# Altium footprint library ZH1.5.PcbLib: 60 footprints (part 1 of 4)
Each footprint in its own frame and in the unit in brackets; x right, y up, seen from the top. Pads: shape width x height; smd on the part's side, far side on the other; paste and mask are expansions set on the pad; w line width, h text height; cw(c..) or ccw(c..) is an arc to the next point about the centre after c.
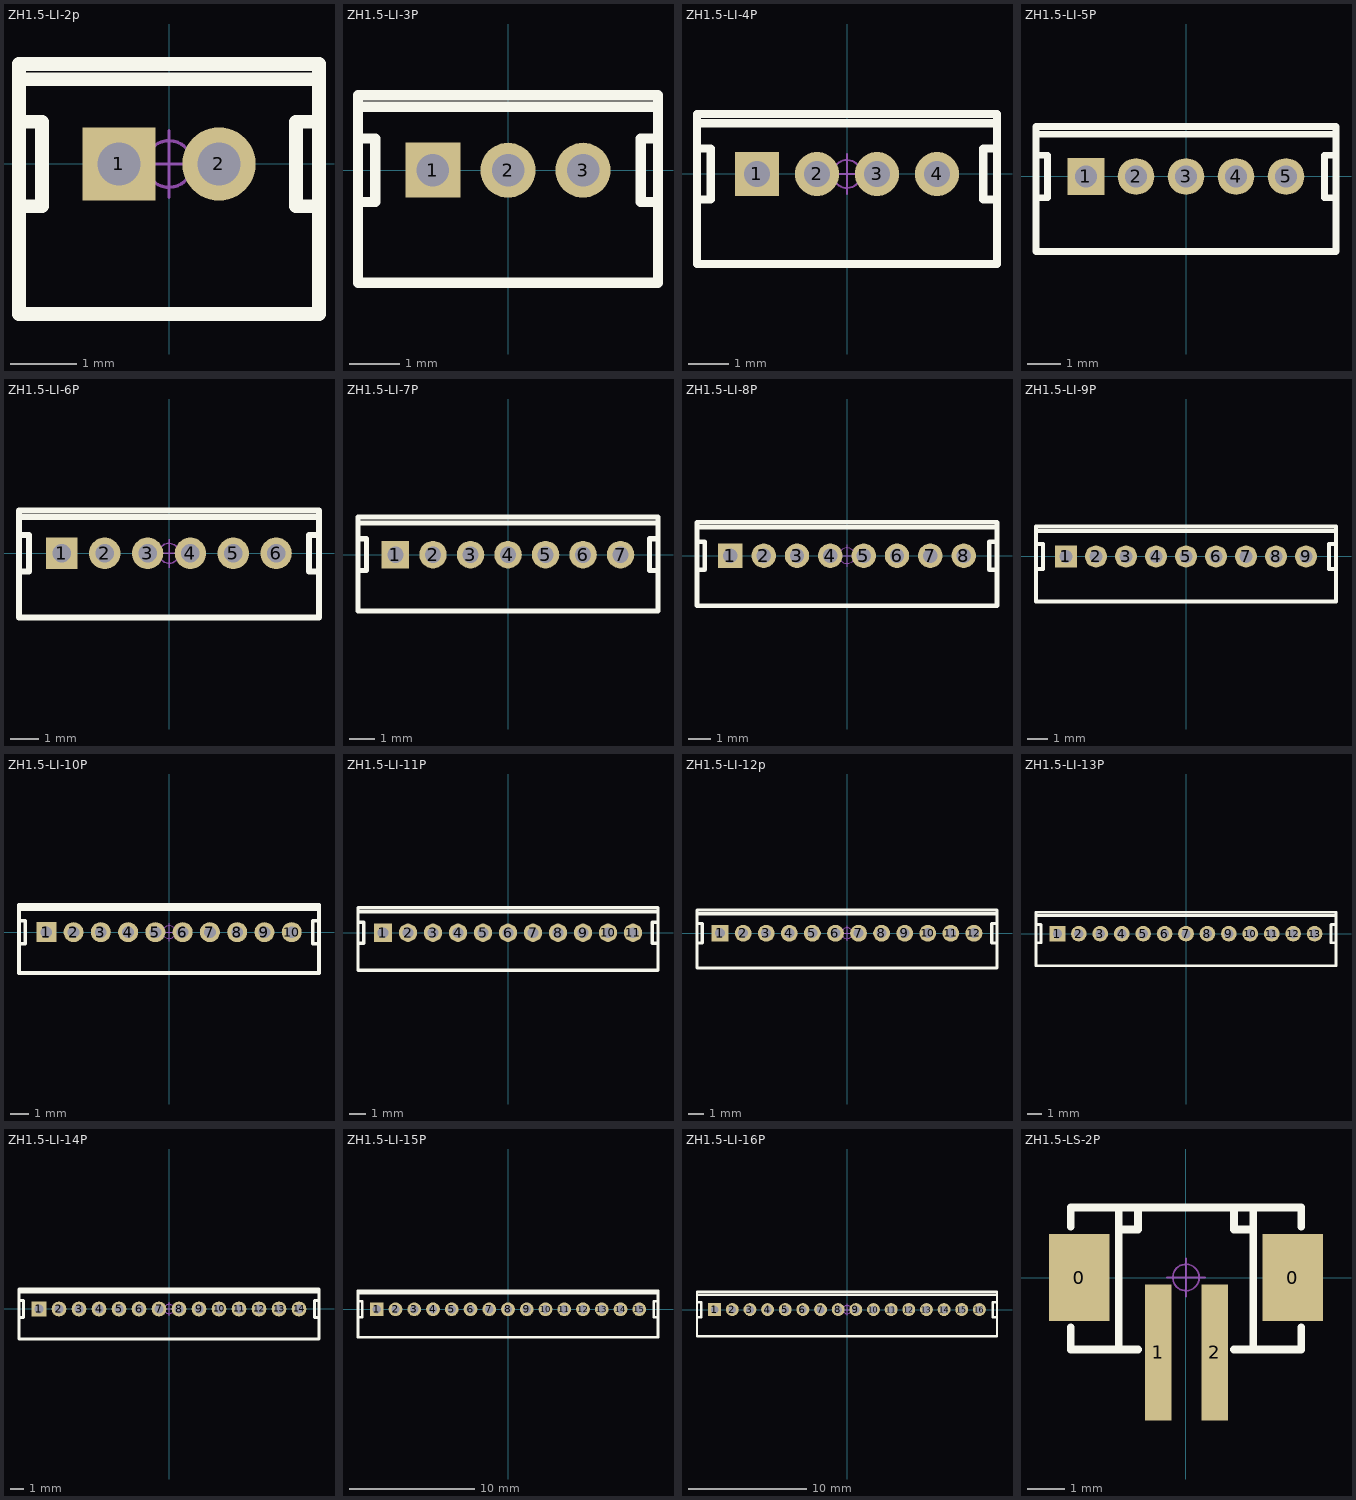
[diagram p0: the footprints below, top view; thin cyan lines are the x and y axes]

## ZH1.5-LI-2p [mm] "长：4.5，宽：3.65，高：4.55"
pads (2):
  rect 1.1x1.1 hole 0.65: 1(-0.75,0)
  round 1.1 hole 0.65: 2(0.75,0)
Top Overlay:
  lines w0.203: -2.25,-0.635 -1.905,-0.635 -1.905,0.635 -2.25,0.635 ; -2.25,1.27 2.25,1.27 ; 2.25,-0.635 1.905,-0.635 1.905,0.635 2.25,0.635 ; -2.25,-2.25 2.25,-2.25 2.25,1.5 -2.25,1.5 -2.25,-2.25
Mechanical 15:
  circle w0.05: c0,0 r0.35
  lines w0.05: -0.5,0 0.5,0 ; 0,-0.5 0,0.5
3D body: height 4.6, standoff -2.55, extent -2.25,-2.15 2.25,1.5

## ZH1.5-LI-3P [mm] "长：6.0，宽：3.65，高：4.55"
pads (3):
  rect 1.1x1.1 hole 0.65: 1(-1.5,0)
  round 1.1 hole 0.65: 2(0,0) 3(1.5,0)
Top Overlay:
  lines w0.203: -3,-0.635 -2.655,-0.635 -2.655,0.635 -3,0.635 ; -3,1.27 3,1.27 ; 3,-0.635 2.655,-0.635 2.655,0.635 3,0.635 ; -3,-2.25 -3,1.5 3,1.5 3,-2.25 -3,-2.25
Mechanical 15:
  circle w0.05: c0,0 r0.35
  lines w0.05: -0.5,0 0.5,0 ; 0,-0.5 0,0.5
3D body: height 4.6, standoff -2.55, extent -3,-2.15 3,1.5

## ZH1.5-LI-4P [mm] "长：7.5，宽：3.65，高：4.55"
pads (4):
  rect 1.1x1.1 hole 0.65: 1(-2.25,0)
  round 1.1 hole 0.65: 2(-0.75,0) 3(0.75,0) 4(2.25,0)
Top Overlay:
  lines w0.203: -3.75,-0.635 -3.405,-0.635 -3.405,0.635 -3.75,0.635 ; -3.75,1.27 3.75,1.27 ; 3.75,-0.635 3.405,-0.635 3.405,0.635 3.75,0.635 ; -3.75,-2.25 -3.75,1.5 3.75,1.5 3.75,-2.25 -3.75,-2.25
Mechanical 15:
  circle w0.05: c0,0 r0.35
  lines w0.05: -0.5,0 0.5,0 ; 0,-0.5 0,0.5
3D body: height 4.6, standoff -2.55, extent -3.75,-2.15 3.75,1.5

## ZH1.5-LI-5P [mm] "长：9.0，宽：3.65，高：4.55"
pads (5):
  rect 1.1x1.1 hole 0.65: 1(-3,0)
  round 1.1 hole 0.65: 2(-1.5,0) 3(0,0) 4(1.5,0) 5(3,0)
Top Overlay:
  lines w0.203: -4.5,-0.635 -4.155,-0.635 -4.155,0.635 -4.5,0.635 ; -4.5,1.27 4.5,1.27 ; 4.5,-0.635 4.155,-0.635 4.155,0.635 4.5,0.635 ; -4.5,-2.25 4.5,-2.25 4.5,1.5 -4.5,1.5 -4.5,-2.25
Mechanical 15:
  circle w0.05: c0,0 r0.35
  lines w0.05: -0.5,0 0.5,0 ; 0,-0.5 0,0.5
3D body: height 4.6, standoff -2.55, extent -4.5,-2.15 4.5,1.5

## ZH1.5-LI-6P [mm] "长：10.5，宽：3.65，高：4.55"
pads (6):
  rect 1.1x1.1 hole 0.65: 1(-3.75,0)
  round 1.1 hole 0.65: 2(-2.25,0) 3(-0.75,0) 4(0.75,0) 5(2.25,0) 6(3.75,0)
Top Overlay:
  lines w0.203: -5.25,-0.635 -4.905,-0.635 -4.905,0.635 -5.25,0.635 ; -5.25,1.27 5.25,1.27 ; 5.25,-0.635 4.905,-0.635 4.905,0.635 5.25,0.635 ; -5.25,-2.25 -5.25,1.5 5.25,1.5 5.25,-2.25 -5.25,-2.25
Mechanical 15:
  circle w0.05: c0,0 r0.35
  lines w0.05: -0.5,0 0.5,0 ; 0,-0.5 0,0.5
3D body: height 4.6, standoff -2.55, extent -5.25,-2.15 5.25,1.5

## ZH1.5-LI-7P [mm] "长：12.0，宽：3.65，高：4.55"
pads (7):
  rect 1.1x1.1 hole 0.65: 1(-4.5,0)
  round 1.1 hole 0.65: 2(-3,0) 3(-1.5,0) 4(0,0) 5(1.5,0) 6(3,0) 7(4.5,0)
Top Overlay:
  lines w0.203: -6,-0.635 -5.655,-0.635 -5.655,0.635 -6,0.635 ; -6,1.27 6,1.27 ; 6,-0.635 5.655,-0.635 5.655,0.635 6,0.635 ; -6,-2.25 6,-2.25 6,1.5 -6,1.5 -6,-2.25
Mechanical 15:
  circle w0.05: c0,0 r0.35
  lines w0.05: -0.5,0 0.5,0 ; 0,-0.5 0,0.5
3D body: height 4.6, standoff -2.55, extent -6,-2.15 6,1.5

## ZH1.5-LI-8P [mm] "长：13.5，宽：3.65，高：4.55"
pads (8):
  rect 1.1x1.1 hole 0.65: 1(-5.25,0)
  round 1.1 hole 0.65: 2(-3.75,0) 3(-2.25,0) 4(-0.75,0) 5(0.75,0) 6(2.25,0) 7(3.75,0) 8(5.25,0)
Top Overlay:
  lines w0.203: -6.75,-0.635 -6.405,-0.635 -6.405,0.635 -6.75,0.635 ; -6.75,1.27 6.75,1.27 ; 6.75,-0.635 6.405,-0.635 6.405,0.635 6.75,0.635 ; -6.75,-2.25 -6.75,1.5 6.75,1.5 6.75,-2.25 -6.75,-2.25
Mechanical 15:
  circle w0.05: c0,0 r0.35
  lines w0.05: -0.5,0 0.5,0 ; 0,-0.5 0,0.5
3D body: height 4.6, standoff -2.55, extent -6.75,-2.15 6.75,1.5

## ZH1.5-LI-9P [mm] "长：15.0，宽：3.65，高：4.55"
pads (9):
  rect 1.1x1.1 hole 0.65: 1(-6,0)
  round 1.1 hole 0.65: 2(-4.5,0) 3(-3,0) 4(-1.5,0) 5(0,0) 6(1.5,0) 7(3,0) 8(4.5,0) 9(6,0)
Top Overlay:
  lines w0.203: -7.5,-0.635 -7.155,-0.635 -7.155,0.635 -7.5,0.635 ; -7.5,1.27 7.5,1.27 ; 7.5,-0.635 7.155,-0.635 7.155,0.635 7.5,0.635 ; -7.5,-2.25 -7.5,1.5 7.5,1.5 7.5,-2.25 -7.5,-2.25
Mechanical 15:
  circle w0.05: c0,0 r0.35
  lines w0.05: -0.5,0 0.5,0 ; 0,-0.5 0,0.5
3D body: height 4.6, standoff -2.55, extent -7.5,-2.15 7.5,1.5

## ZH1.5-LI-10P [mm] "长：16.5，宽：3.65，高：4.55"
pads (10):
  rect 1.1x1.1 hole 0.65: 1(-6.75,0)
  round 1.1 hole 0.65: 2(-5.25,0) 3(-3.75,0) 4(-2.25,0) 5(-0.75,0) 6(0.75,0) 7(2.25,0) 8(3.75,0) 9(5.25,0) 10(6.75,0)
Top Overlay:
  lines w0.203: -8.25,-0.635 -7.905,-0.635 -7.905,0.635 -8.25,0.635 ; -8.25,1.27 8.25,1.27 ; 8.25,-0.635 7.905,-0.635 7.905,0.635 8.25,0.635 ; -8.25,-2.25 8.25,-2.25 8.25,1.5 -8.25,1.5 -8.25,-2.25
Mechanical 15:
  circle w0.05: c0,0 r0.35
  lines w0.05: -0.5,0 0.5,0 ; 0,-0.5 0,0.5
3D body: height 4.6, standoff -2.55, extent -8.25,-2.15 8.25,1.5

## ZH1.5-LI-11P [mm] "长：18.0，宽：3.65，高：4.55"
pads (11):
  rect 1.1x1.1 hole 0.65: 1(-7.5,0)
  round 1.1 hole 0.65: 2(-6,0) 3(-4.5,0) 4(-3,0) 5(-1.5,0) 6(0,0) 7(1.5,0) 8(3,0) 9(4.5,0) 10(6,0) 11(7.5,0)
Top Overlay:
  lines w0.203: -9,-0.635 -8.655,-0.635 -8.655,0.635 -9,0.635 ; -9,1.27 9,1.27 ; 9,-0.635 8.655,-0.635 8.655,0.635 9,0.635 ; -9,-2.25 -9,1.5 9,1.5 9,-2.25 -9,-2.25
Mechanical 15:
  circle w0.05: c0,0 r0.35
  lines w0.05: -0.5,0 0.5,0 ; 0,-0.5 0,0.5
3D body: height 4.6, standoff -2.55, extent -9,-2.15 9,1.5

## ZH1.5-LI-12p [mm] "长：19.5，宽：3.65，高：4.55"
pads (12):
  rect 1.1x1.1 hole 0.65: 1(-8.25,0)
  round 1.1 hole 0.65: 2(-6.75,0) 3(-5.25,0) 4(-3.75,0) 5(-2.25,0) 6(-0.75,0) 7(0.75,0) 8(2.25,0) 9(3.75,0) 10(5.25,0) 11(6.75,0) 12(8.25,0)
Top Overlay:
  lines w0.203: -9.75,-0.635 -9.405,-0.635 -9.405,0.635 -9.75,0.635 ; -9.75,1.27 9.75,1.27 ; 9.75,-0.635 9.405,-0.635 9.405,0.635 9.75,0.635 ; -9.75,-2.25 9.75,-2.25 9.75,1.5 -9.75,1.5 -9.75,-2.25
Mechanical 15:
  circle w0.05: c0,0 r0.35
  lines w0.05: -0.5,0 0.5,0 ; 0,-0.5 0,0.5
3D body: height 4.6, standoff -2.55, extent -9.75,-2.15 9.75,1.5

## ZH1.5-LI-13P [mm] "长：21.0，宽：3.65，高：4.55"
pads (13):
  rect 1.1x1.1 hole 0.65: 1(-9,0)
  round 1.1 hole 0.65: 2(-7.5,0) 3(-6,0) 4(-4.5,0) 5(-3,0) 6(-1.5,0) 7(0,0) 8(1.5,0) 9(3,0) 10(4.5,0) 11(6,0) 12(7.5,0) 13(9,0)
Top Overlay:
  lines w0.203: -10.5,-0.635 -10.155,-0.635 -10.155,0.635 -10.5,0.635 ; -10.5,1.27 10.5,1.27 ; 10.5,-0.635 10.155,-0.635 10.155,0.635 10.5,0.635 ; -10.5,-2.25 10.5,-2.25 10.5,1.5 -10.5,1.5 -10.5,-2.25
Mechanical 15:
  circle w0.05: c0,0 r0.35
  lines w0.05: -0.5,0 0.5,0 ; 0,-0.5 0,0.5
3D body: height 4.6, standoff -2.55, extent -10.5,-2.15 10.5,1.5

## ZH1.5-LI-14P [mm] "长：22.5，宽：3.65，高：4.55"
pads (14):
  rect 1.1x1.1 hole 0.65: 1(-9.75,0)
  round 1.1 hole 0.65: 2(-8.25,0) 3(-6.75,0) 4(-5.25,0) 5(-3.75,0) 6(-2.25,0) 7(-0.75,0) 8(0.75,0) 9(2.25,0) 10(3.75,0) 11(5.25,0) 12(6.75,0) 13(8.25,0) 14(9.75,0)
Top Overlay:
  lines w0.203: -11.25,-0.635 -10.905,-0.635 -10.905,0.635 -11.25,0.635 ; -11.25,1.27 11.25,1.27 ; 11.25,-0.635 10.905,-0.635 10.905,0.635 11.25,0.635 ; -11.25,-2.25 -11.25,1.5 11.25,1.5 11.25,-2.25 -11.25,-2.25
Mechanical 15:
  circle w0.05: c0,0 r0.35
  lines w0.05: -0.5,0 0.5,0 ; 0,-0.5 0,0.5
3D body: height 4.6, standoff -2.55, extent -11.25,-2.15 11.25,1.5

## ZH1.5-LI-15P [mm] "长：24.0，宽：3.65，高：4.55"
pads (15):
  rect 1.1x1.1 hole 0.65: 1(-10.5,0)
  round 1.1 hole 0.65: 2(-9,0) 3(-7.5,0) 4(-6,0) 5(-4.5,0) 6(-3,0) 7(-1.5,0) 8(0,0) 9(1.5,0) 10(3,0) 11(4.5,0) 12(6,0) 13(7.5,0) 14(9,0) 15(10.5,0)
Top Overlay:
  lines w0.203: -12,-0.635 -11.655,-0.635 -11.655,0.635 -12,0.635 ; -12,1.27 12,1.27 ; 12,-0.635 11.655,-0.635 11.655,0.635 12,0.635 ; -12,-2.25 -12,1.5 12,1.5 12,-2.25 -12,-2.25
Mechanical 15:
  circle w0.05: c0,0 r0.35
  lines w0.05: -0.5,0 0.5,0 ; 0,-0.5 0,0.5
3D body: height 4.6, standoff -2.55, extent -12,-2.15 12,1.5

## ZH1.5-LI-16P [mm] "长：25.5，宽：3.65，高：4.55"
pads (16):
  rect 1.1x1.1 hole 0.65: 1(-11.25,0)
  round 1.1 hole 0.65: 2(-9.75,0) 3(-8.25,0) 4(-6.75,0) 5(-5.25,0) 6(-3.75,0) 7(-2.25,0) 8(-0.75,0) 9(0.75,0) 10(2.25,0) 11(3.75,0) 12(5.25,0) 13(6.75,0) 14(8.25,0) 15(9.75,0) 16(11.25,0)
Top Overlay:
  lines w0.203: -12.75,-0.635 -12.405,-0.635 -12.405,0.635 -12.75,0.635 ; -12.75,1.27 12.75,1.27 ; 12.75,-0.635 12.405,-0.635 12.405,0.635 12.75,0.635 ; -12.75,-2.25 -12.75,1.5 12.75,1.5 12.75,-2.25 -12.75,-2.25
Mechanical 15:
  circle w0.05: c0,0 r0.35
  lines w0.05: -0.5,0 0.5,0 ; 0,-0.5 0,0.5
3D body: height 4.6, standoff -2.55, extent -12.75,-2.15 12.75,1.5

## ZH1.5-LS-2P [mm] "长：6.0mm，宽：3.7mm，高：5.0mm"
pads (4):
  rect 1.6x2.3 smd: 0(-2.816,0) 0(2.82,0)
  rect 0.7x3.6 smd: 1(-0.736,-1.981) 2(0.764,-1.981)
Top Overlay:
  lines w0.203: -3.048,-1.318 -3.048,-1.905 -1.27,-1.905 ; -3.048,1.349 -3.048,1.85 3.052,1.85 3.052,1.349 3.048,1.349 ; -1.778,-1.905 -1.778,1.85 ; -1.778,1.27 -1.27,1.27 -1.27,1.85 ; 1.27,-1.905 3.052,-1.905 3.052,-1.318 3.048,-1.318 ; 1.27,1.85 1.27,1.27 1.651,1.27 ; 1.782,-1.905 1.782,1.85
Mechanical 15:
  circle w0.05: c0.002,0 r0.35
  lines w0.05: -0.498,0 0.502,0 ; 0.002,-0.5 0.002,0.5
3D body: height 5.05, standoff 0, extent -3.048,-3.35 3.052,1.85